# Altium footprint library NUCLEOG431RB-Custom-IN-A2212.PcbLib: 80 footprints (part 2 of 5)
Each footprint in its own frame and in the unit in brackets; x right, y up, seen from the top. Pads: shape width x height; smd on the part's side, far side on the other; paste and mask are expansions set on the pad; w line width, h text height; cw(c..) or ccw(c..) is an arc to the next point about the centre after c.
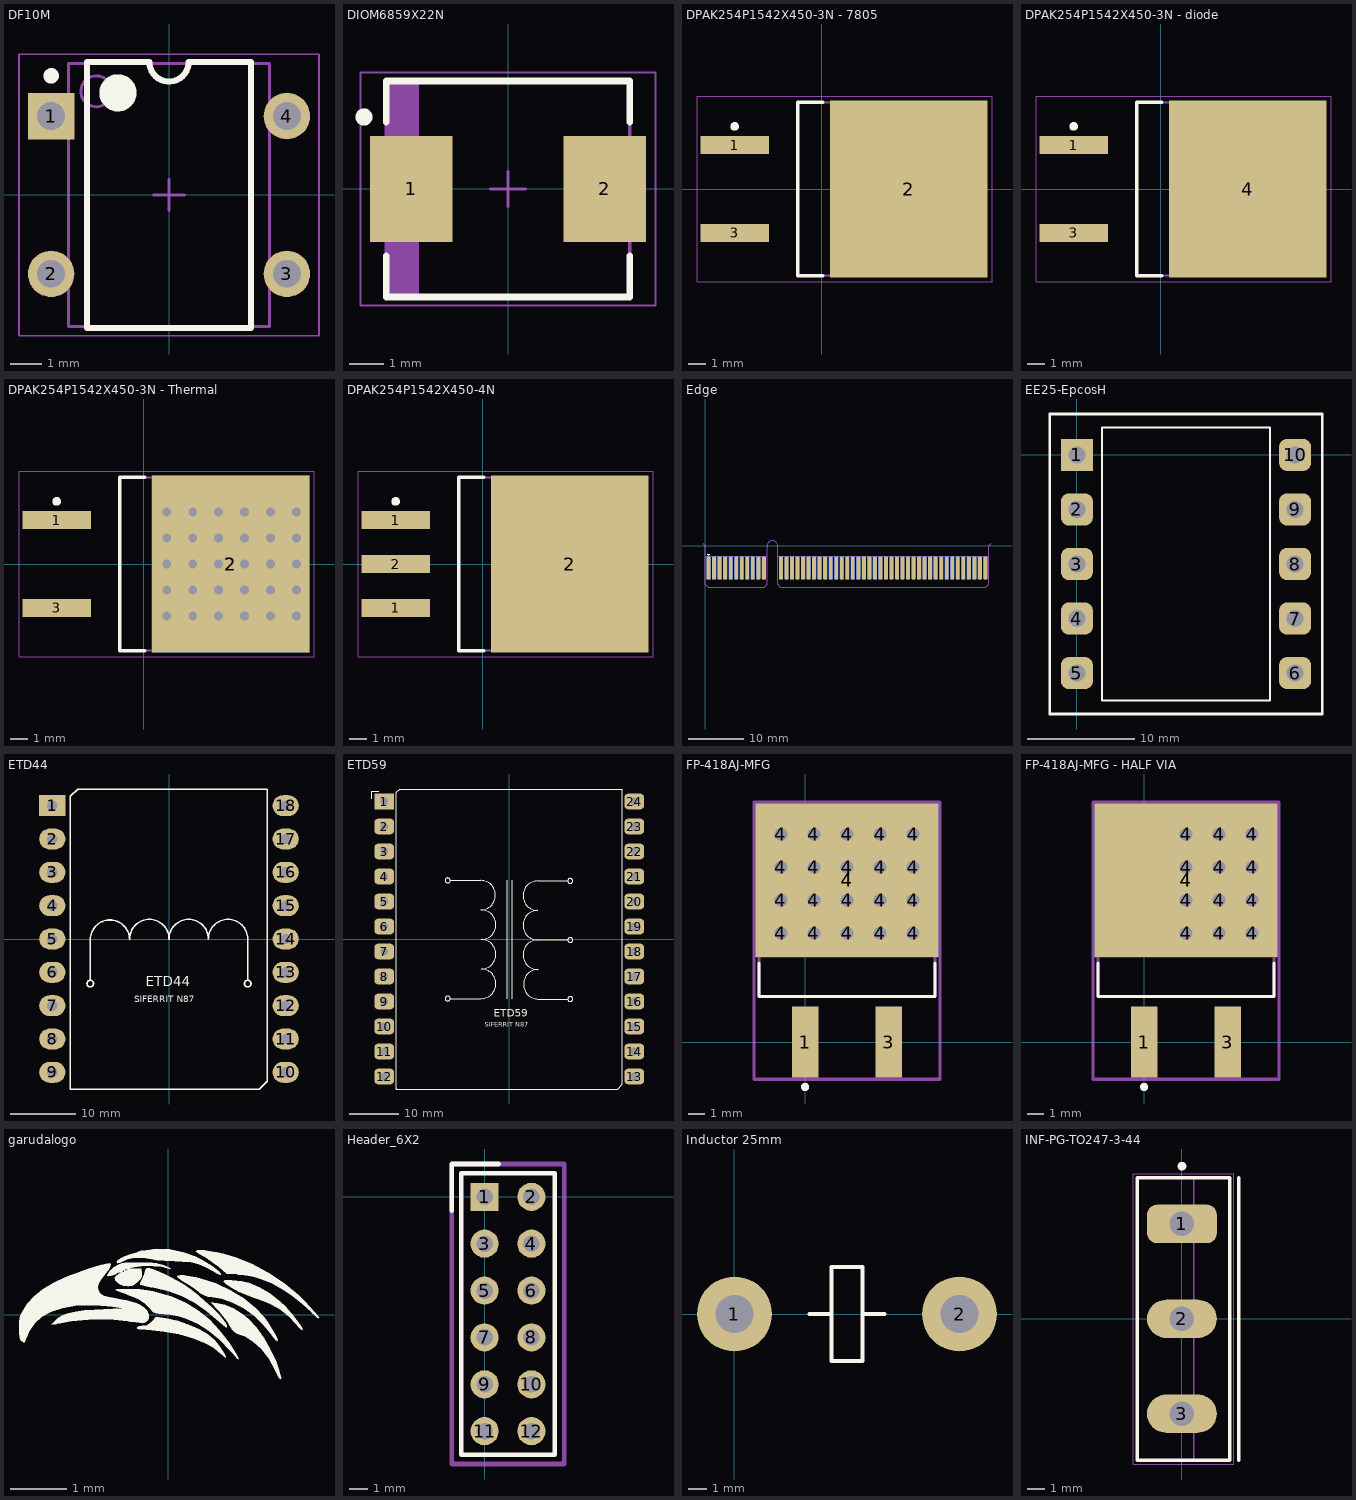
[diagram p1: the footprints below, top view; thin cyan lines are the x and y axes]

## DF10M [mm]
pads (4):
  rect 1.5x1.5 hole 0.9: 1(-3.81,2.55)
  round 1.5 hole 0.9: 2(-3.81,-2.55) 3(3.81,-2.55) 4(3.81,2.55)
Top Overlay:
  circle w0.6: c-1.65,3.3 r0.3
  circle w0.25: c-3.81,3.85 r0.125
  lines w0.2: -2.65,-4.3 2.65,-4.3 2.65,4.3 0.635,4.3 cw(c0,4.3) -0.635,4.3 -2.65,4.3 -2.65,-4.3
Mechanical 13:
  circle w0.1: c-2.35,3.35 r0.5
  lines w0.1: -3.25,-4.25 3.25,-4.25 3.25,4.25 -3.25,4.25 -3.25,-4.25
Mechanical 15:
  lines w0.05: -4.85,-4.55 4.85,-4.55 4.85,4.55 -4.85,4.55 -4.85,-4.55
  lines w0.1: -0.5,0 0.5,0 ; 0,-0.5 0,0.5
3D body "Diode_Bridge_DIP-4_W7.62mm_P5.08mm.step": height 3.5, standoff -3, extent -4.01,-4.318 4.01,4.182

## DIOM6859X22N [mm] "Molded Diode, 2-Leads, Body 6.85x5.91mm, IPC Medium Density"
height 2.25
pads (2):
  rect 2.4x3.1 smd: 1(-2.825,0) 2(2.825,0)
Top Overlay:
  circle w0.25: c-4.2,2.1 r0.125
  lines w0.2: -3.55,-1.95 -3.55,-3.15 3.55,-3.15 3.55,-1.95 ; -3.55,1.95 -3.55,3.15 3.55,3.15 3.55,1.95
Mechanical 13:
  rectangle: -3.55,-3.11 -2.595,3.11
  lines w0.1: -3.55,-3.11 -3.55,3.11 3.55,3.11 3.55,-3.11 -3.55,-3.11
Mechanical 15:
  lines w0.05: -4.3,-3.4 -4.3,3.4 4.3,3.4 4.3,-3.4 -4.3,-3.4
  lines w0.1: -0.5,0 0.5,0 ; 0,-0.5 0,0.5
3D body "DIOM6859X22N.step": height 2.25, standoff 0, extent -3.77,-3.11 3.77,3.11

## DPAK254P1542X450-3N - 7805 [mm] "D2-PAK, 3-Pads, Body 7.60x8.36mm (max), IPC Medium Density"
height 4.5
pads (3):
  rect 3.95x1.05 smd: 1(-5.025,2.54) 3(-5.025,-2.54)
  rect 9.1x10.2 smd: 2(5.025,0)
Top Overlay:
  circle w0.25: c-5.025,3.615 r0.125
  lines w0.2: 0.075,-5 -1.375,-5 -1.375,5 0.075,5
Mechanical 13:
  lines w0.1: -1.375,-5 7.625,-5 7.625,5 -1.375,5 -1.375,-5
Mechanical 15:
  lines w0.05: -7.2,-5.35 9.85,-5.35 9.85,5.35 -7.2,5.35 -7.2,-5.35
  lines w0.1: 0.825,0 1.825,0 ; 1.325,-0.5 1.325,0.5
3D body "TO-263-2.step": height 4.67, standoff 0.25, extent -6.175,-5 8.825,5

## DPAK254P1542X450-3N - diode [mm] "D2-PAK, 3-Pads, Body 7.60x8.36mm (max), IPC Medium Density"
height 4.5
pads (3):
  rect 3.95x1.05 smd: 1(-5.025,2.54) 3(-5.025,-2.54)
  rect 9.1x10.2 smd: 4(5.025,0)
Top Overlay:
  circle w0.25: c-5.025,3.615 r0.125
  lines w0.2: 0.075,-5 -1.375,-5 -1.375,5 0.075,5
Mechanical 13:
  lines w0.1: -1.375,-5 -1.375,5 7.625,5 7.625,-5 -1.375,-5
Mechanical 15:
  lines w0.05: -7.2,-5.35 -7.2,5.35 9.85,5.35 9.85,-5.35 -7.2,-5.35
  lines w0.1: 0.825,0 1.825,0 ; 1.325,-0.5 1.325,0.5
3D body "TO-263-2.step": height 4.67, standoff 0.25, extent -6.175,-5 8.825,5

## DPAK254P1542X450-3N - Thermal [mm] "D2-PAK, 3-Pads, Body 7.60x8.36mm (max), IPC Medium Density"
height 4.5
pads (4):
  rect 3.95x1.05 smd: 1(-5.025,2.54) 3(-5.025,-2.54)
  rect 9.1x10.2 smd: 2(5.025,0)
  rect 9.1x10.2 smd far side: 2(5.025,0)
via 8.825,-3 diameter 1 hole 0.5
via 7.325,-3 diameter 1 hole 0.5
via 5.825,-3 diameter 1 hole 0.5
via 4.325,-3 diameter 1 hole 0.5
via 2.825,-3 diameter 1 hole 0.5
via 1.325,-3 diameter 1 hole 0.5
via 8.825,-1.5 diameter 1 hole 0.5
via 7.325,-1.5 diameter 1 hole 0.5
via 5.825,-1.5 diameter 1 hole 0.5
via 4.325,-1.5 diameter 1 hole 0.5
via 2.825,-1.5 diameter 1 hole 0.5
via 1.325,-1.5 diameter 1 hole 0.5
via 8.825,3 diameter 1 hole 0.5
via 7.325,3 diameter 1 hole 0.5
via 5.825,3 diameter 1 hole 0.5
via 4.325,3 diameter 1 hole 0.5
via 2.825,3 diameter 1 hole 0.5
via 1.325,3 diameter 1 hole 0.5
via 8.825,1.5 diameter 1 hole 0.5
via 7.325,1.5 diameter 1 hole 0.5
via 5.825,1.5 diameter 1 hole 0.5
via 4.325,1.5 diameter 1 hole 0.5
via 2.825,1.5 diameter 1 hole 0.5
via 1.325,1.5 diameter 1 hole 0.5
via 8.825,0 diameter 1 hole 0.5
via 7.325,0 diameter 1 hole 0.5
via 5.825,0 diameter 1 hole 0.5
via 4.325,0 diameter 1 hole 0.5
via 2.825,0 diameter 1 hole 0.5
via 1.325,0 diameter 1 hole 0.5
Top Overlay:
  circle w0.25: c-5.025,3.615 r0.125
  lines w0.2: 0.075,-5 -1.375,-5 -1.375,5 0.075,5
Mechanical 13:
  lines w0.1: -1.375,-5 7.625,-5 7.625,5 -1.375,5 -1.375,-5
Mechanical 15:
  lines w0.05: -7.2,-5.35 9.85,-5.35 9.85,5.35 -7.2,5.35 -7.2,-5.35
  lines w0.1: 0.825,0 1.825,0 ; 1.325,-0.5 1.325,0.5
3D body "TO-263-2.step": height 4.67, standoff 0.25, extent -6.175,-5 8.825,5

## DPAK254P1542X450-4N [mm] "D2-PAK, 3-Pads, Body 7.60x8.36mm (max), IPC Medium Density"
height 4.5
pads (4):
  rect 3.95x1.05 smd: 1(-5.025,-2.54) 1(-5.025,2.54) 2(-5.025,0)
  rect 9.1x10.2 smd: 2(5.025,0)
Top Overlay:
  circle w0.25: c-5.025,3.615 r0.125
  lines w0.2: 0.075,-5 -1.375,-5 -1.375,5 0.075,5
Mechanical 13:
  lines w0.1: -1.375,-5 7.625,-5 7.625,5 -1.375,5 -1.375,-5
Mechanical 15:
  lines w0.05: -7.2,-5.35 9.85,-5.35 9.85,5.35 -7.2,5.35 -7.2,-5.35
  lines w0.1: 0.825,0 1.825,0 ; 1.325,-0.5 1.325,0.5
3D body "TO-263-2.step": height 4.42, standoff 0, extent -6.175,-5 8.825,5

## Edge [mm]
pads (98):
  rect 0.7x4.2 smd: A1(0.6,-4)
  rrect50% 0.7x4.2 smd: A2(1.6,-4) A3(2.6,-4) A4(3.6,-4) A5(4.6,-4) A6(5.6,-4) A7(6.6,-4) A8(7.6,-4) A9(8.6,-4) A10(9.6,-4) A11(10.6,-4) A12(13.7,-4) A13(14.7,-4) A14(15.7,-4) A15(16.7,-4) A16(17.7,-4) A17(18.7,-4) A18(19.7,-4) A19(20.7,-4) A20(21.7,-4) A21(22.7,-4) A22(23.7,-4) A23(24.7,-4) A24(25.7,-4) A25(26.7,-4) A26(27.7,-4) A27(28.7,-4) A28(29.7,-4) A29(30.7,-4) A30(31.7,-4) A31(32.7,-4) A32(33.7,-4) A33(34.7,-4) A34(35.7,-4) A35(36.7,-4) A36(37.7,-4) A37(38.7,-4) A38(39.7,-4) A39(40.7,-4) A40(41.7,-4) A41(42.7,-4) A42(43.7,-4) A43(44.7,-4) A44(45.7,-4) A45(46.7,-4) A46(47.7,-4) A47(48.7,-4) A48(49.7,-4) A49(50.7,-4)
  rect 0.7x4.2 smd far side: B1(0.6,-4)
  rrect50% 0.7x4.2 smd far side: B2(1.6,-4) B3(2.6,-4) B4(3.6,-4) B5(4.6,-4) B6(5.6,-4) B7(6.6,-4) B8(7.6,-4) B9(8.6,-4) B10(9.6,-4) B11(10.6,-4) B12(13.7,-4) B13(14.7,-4) B14(15.7,-4) B15(16.7,-4) B16(17.7,-4) B17(18.7,-4) B18(19.7,-4) B19(20.7,-4) B20(21.7,-4) B21(22.7,-4) B22(23.7,-4) B23(24.7,-4) B24(25.7,-4) B25(26.7,-4) B26(27.7,-4) B27(28.7,-4) B28(29.7,-4) B29(30.7,-4) B30(31.7,-4) B31(32.7,-4) B32(33.7,-4) B33(34.7,-4) B34(35.7,-4) B35(36.7,-4) B36(37.7,-4) B37(38.7,-4) B38(39.7,-4) B39(40.7,-4) B40(41.7,-4) B41(42.7,-4) B42(43.7,-4) B43(44.7,-4) B44(45.7,-4) B45(46.7,-4) B46(47.7,-4) B47(48.7,-4) B48(49.7,-4) B49(50.7,-4)
Top Overlay:
  lines w0.05: 0.4,-1.5 0.8,-1.5 ; 0.4,-1.5 0.6,-1.7 ; 0.4,-1.5 0.8,-1.5 ; 0.4,-1.5 0.6,-1.7 ; 0.6,-1.7 0.8,-1.5 ; 0.6,-1.7 0.6,-1.7 ; 0.6,-1.7 0.8,-1.5 ; 0.6,-1.7 0.6,-1.7
Mechanical 15:
  lines w0.013: -0.5,0.5 0,0 0,-7 0.5,-7.5 10.7,-7.5 11.2,-7 11.2,-0.05 cw(c12.15,-0.05) 13.1,-0.05 13.1,-7 13.6,-7.5 50.8,-7.5 51.3,-7 51.3,0 51.8,0.5 ; 0,-1.9 11.2,-1.9 ; 13.1,-1.9 51.3,-1.9

## EE25-EpcosH [mm]
pads (10):
  rect 3x3 hole 1.6: 1(0,0)
  rrect50% 3x3 hole 1.6: 2(0,-5.08) 3(0,-10.16) 4(0,-15.24) 5(0,-20.32) 6(20.32,-20.32) 7(20.32,-15.24) 8(20.32,-10.16) 9(20.32,-5.08) 10(20.32,0)
Top Overlay:
  lines w0.2: 2.335,-22.86 17.985,-22.86 17.985,2.54 11.43,2.54 2.335,2.54 2.335,-22.86
  lines w0.254: -2.54,-24.13 -2.54,2.54 -2.54,3.81 22.86,3.81 22.86,-24.13 -2.54,-24.13
Mechanical 1:
  text "'.Designator'" at 10.033,-18.034 h1.52
3D body "E25-13-7-and-B66208B(horizontal).STEP": height 20.9, standoff -3.1, extent -3.9,-23.91 24.1,3.59

## ETD44 [mm]
pads (18):
  rect 4x3.2 hole 1.6: 1(-17.78,20.32)
  oval 4x3.2 hole 1.6: 2(-17.78,15.24) 3(-17.78,10.16) 4(-17.78,5.08) 5(-17.78,0) 6(-17.78,-5.08) 7(-17.78,-10.16) 8(-17.78,-15.24) 9(-17.78,-20.32) 10(17.78,-20.32) 11(17.78,-15.24) 12(17.78,-10.16) 13(17.78,-5.08) 14(17.78,0) 15(17.78,5.08) 16(17.78,10.16) 17(17.78,15.24) 18(17.78,20.32)
Top Overlay:
  circle w0.254: c12,-6.8 r0.5
  circle w0.254: c-12,-6.8 r0.5
  lines w0.2: -15.03,-22.86 -15.03,21.72 -13.89,22.86 1.27,22.86 14.945,22.86 14.945,-21.68 13.765,-22.86 -15.03,-22.86
  lines w0.254: -12,-6.2 -12,-0.1 cw(c-9,-0.1) -6,-0.1 ; -6,0 cw(c-3,0) 0,0 cw(c3,0) 6,0 cw(c9,0) 12,0 12,-6.2
  text "ETD44" at -3.521,-7.171 h1.52
  text "SIFERRIT N87" at -5.296,-9.621 h1
3D body "User Library-ETD44_NO_AIRGAP.STEP": height 38.1, standoff -4.5, extent -25.5,-24.8 25.5,24.8

## ETD59 [mm]
pads (24):
  rect 4x3.2 hole 1.6: 1(-25.4,27.94)
  rrect50% 4x3.2 hole 1.6: 2(-25.4,22.86) 3(-25.4,17.78) 4(-25.4,12.7) 5(-25.4,7.62) 6(-25.4,2.54) 7(-25.4,-2.54) 8(-25.4,-7.62) 9(-25.4,-12.7) 10(-25.4,-17.78) 11(-25.4,-22.86) 12(-25.4,-27.94) 13(25.4,-27.94) 14(25.4,-22.86) 15(25.4,-17.78) 16(25.4,-12.7) 17(25.4,-7.62) 18(25.4,-2.54) 19(25.4,2.54) 20(25.4,7.62) 21(25.4,12.7) 22(25.4,17.78) 23(25.4,22.86) 24(25.4,27.94)
Top Overlay:
  circle w0.254: c-12.5,11.9 r0.5
  circle w0.254: c-12.5,-12.1 r0.5
  circle w0.254: c12.4,11.8 r0.5
  circle w0.254: c12.4,-0.2 r0.5
  circle w0.254: c12.4,-12.2 r0.5
  lines w0.2: -27.9,28.5 -27.9,29 -27.9,30 -26.5,30 ; -22.965,-30.48 -22.965,29.785 -22.27,30.48 -1.27,30.48 ; -22.965,-30.465 -22.95,-30.48 22.02,-30.48 22.965,-29.535 22.965,30.48 -1.4,30.48 ; -0.4,-12.1 -0.4,11.9 ; 0.6,-12.1 0.6,11.9
  lines w0.254: -11.9,-12.1 -5.7,-12.1 ccw(c-5.7,-9.1) -5.7,-6.1 ccw(c-5.7,-3.1) -5.7,-0.1 ccw(c-5.7,2.9) -5.7,5.9 ; -11.9,11.9 -5.8,11.9 cw(c-5.8,8.9) -5.8,5.9 ; 5.8,-12.2 11.9,-12.2 ; 5.8,-6.2 cw(c5.8,-3.2) 5.8,-0.2 ; 5.9,-12.2 cw(c5.9,-9.2) 5.9,-6.2 ; 11.9,-0.2 5.8,-0.2 ; 11.9,11.8 5.8,11.8 ccw(c5.8,8.8) 5.8,5.8 ccw(c5.8,2.8) 5.8,-0.2
  text "SIFERRIT N87" at -4.946,-17.846 h1
  text "ETD59" at -3.146,-15.846 h1.52
3D body "User Library-ETD59.STEP": height 51.31, standoff -1.69, extent -32.953,-35.86 33.146,31.04

## FP-418AJ-MFG [mil]
pads (24):
  rect 63x169 smd paste+0 mask+0: 1(0,0) 3(200,0)
  round 60 hole 30: 4(-57.48,259.03) 4(-57.48,337.77) 4(-57.48,416.51) 4(-57.48,495.25) 4(21.26,259.03) 4(21.26,337.77) 4(21.26,416.51) 4(21.26,495.25) 4(100,259.03) 4(100,337.77) 4(100,416.51) 4(100,495.25) 4(178.74,259.03) 4(178.74,337.77) 4(178.74,416.51) 4(178.74,495.25) 4(257.48,259.03) 4(257.48,337.77) 4(257.48,416.51) 4(257.48,495.25)
  rect 436x366 smd: 4(100,385.5)
  rect 436x366 smd far side paste+0 mask+0: 4(100,385.5)
Top Overlay:
  circle w9.84: c0,-107.11 r4.92
  lines w7.87: -110.04,187.74 -110.04,108.44 310.04,108.44 310.04,187.74
Mechanical 5:
  lines w7.87: -121.94,-88.44 321.94,-88.44 321.94,572.44 -121.94,572.44 -121.94,-88.44
  text ".Designator" at 100,241.98 h39.37
Mechanical 13:
  lines w7.87: -110.04,108.44 310.04,108.44 310.04,488.36 -110.04,488.36 -110.04,108.44
Mechanical 15:
  lines w7.87: -121.94,-88.44 321.94,-88.44 321.94,572.44 -121.94,572.44 -121.94,-88.44
Mechanical 16:
  lines w3.94: 80.31,298.4 119.69,298.4 ; 100,278.71 100,318.08
3D body "Trans_ON_Semiconductor_FDB2532_eec.STEP": height 10, standoff 0, extent -121.94,-88.44 321.94,572.44

## FP-418AJ-MFG - HALF VIA [mil]
pads (16):
  rect 63x169 smd paste+0 mask+0: 1(0,0) 3(200,0)
  round 60 hole 30: 4(100,259.03) 4(100,337.77) 4(100,416.51) 4(100,495.25) 4(178.74,259.03) 4(178.74,337.77) 4(178.74,416.51) 4(178.74,495.25) 4(257.48,259.03) 4(257.48,337.77) 4(257.48,416.51) 4(257.48,495.25)
  rect 436x366 smd: 4(100,385.5)
  rect 436x366 smd far side: 4(100,385.5)
Top Overlay:
  circle w9.84: c0,-107.11 r4.92
  lines w7.87: -110.04,187.74 -110.04,108.44 310.04,108.44 310.04,187.74
Mechanical 5:
  lines w7.87: -121.94,-88.44 -121.94,572.44 321.94,572.44 321.94,-88.44 -121.94,-88.44
  text ".Designator" at 100,241.98 h39.37
Mechanical 13:
  lines w7.87: -110.04,108.44 -110.04,488.36 310.04,488.36 310.04,108.44 -110.04,108.44
Mechanical 15:
  lines w7.87: -121.94,-88.44 -121.94,572.44 321.94,572.44 321.94,-88.44 -121.94,-88.44
Mechanical 16:
  lines w3.94: 80.31,298.4 119.69,298.4 ; 100,278.71 100,318.08
3D body "Trans_ON_Semiconductor_FDB2532_eec.STEP": height 10, standoff 0, extent -121.94,-88.44 321.94,572.44

## garudalogo [mm]
Top Overlay:
  drawing of 10 lines, arcs and shapes, not listed

## Header_6X2 [mil]
pads (12):
  rect 60x60 hole 35.43: 1(0,0)
  round 60 hole 35.43: 2(100,0) 3(0,-100) 4(100,-100) 5(0,-200) 6(100,-200) 7(0,-300) 8(100,-300) 9(0,-400) 10(100,-400) 11(0,-500) 12(100,-500)
Top Overlay:
  lines w10: -70,-30 -70,70 30,70 ; -50,-550 -50,50 150,50 150,-550 -30,-550 -50,-550
Mechanical 13:
  lines w10: -70,-570 -70,70 170,70 170,-570 -70,-570
  text "'.Designator'" at -129.99,-600 h60
3D body "PinHeader_2x06_P2.54mm_Horizontal.step": height 200, standoff -118.11, extent -12.59,-550 495.28,50

## Inductor 25mm [mm]
pads (2):
  round 4 hole 2: 1(0,0) 2(12,0)
Top Overlay:
  lines w0.2: 4,0 5.175,0 ; 6.825,0 8,0 ; 5.175,0 5.175,-2.5 6.825,-2.5 6.825,2.5 5.175,2.5 5.175,0
3D body "02.STEP": height 25.26, standoff -2.47, extent -0.859,-12.328 12.71,12.028

## INF-PG-TO247-3-44 [mm] "FM, 3-Leads, Body 5.02x15.94mm, Pitch 5.44mm"
height 25.5
pads (3):
  rrect50% 4x2.2 hole 1.4: 1(0,5.44)
  oval 4x2.2 hole 1.4: 2(0,0) 3(0,-5.44)
Top Overlay:
  circle w0.25: c0,8.75 r0.125
  lines w0.2: 3.245,-8.1 3.245,8.1 ; -2.555,-8.1 -2.555,8.1 2.745,8.1 2.745,-8.1 -2.555,-8.1
Mechanical 13:
  lines w0.1: 0.67,-8.075 0.67,8.075 ; -2.53,-8.075 2.72,-8.075 2.72,8.075 -2.53,8.075 -2.53,-8.075
Mechanical 15:
  lines w0.05: -2.78,-8.325 2.97,-8.325 2.97,8.325 -2.78,8.325 -2.78,-8.325
  lines w0.1: -0.5,0 0.5,0 ; 0,-0.5 0,0.5
3D body "TO-247-3_Vertical.step": height 26.54, standoff -14.56, extent -2.33,-7.96 2.7,7.94